# Altium footprint library PrISUm-ICs.PcbLib: 42 footprints (part 2 of 3)
Each footprint in its own frame and in the unit in brackets; x right, y up, seen from the top. Pads: shape width x height; smd on the part's side, far side on the other; paste and mask are expansions set on the pad; w line width, h text height; cw(c..) or ccw(c..) is an arc to the next point about the centre after c.
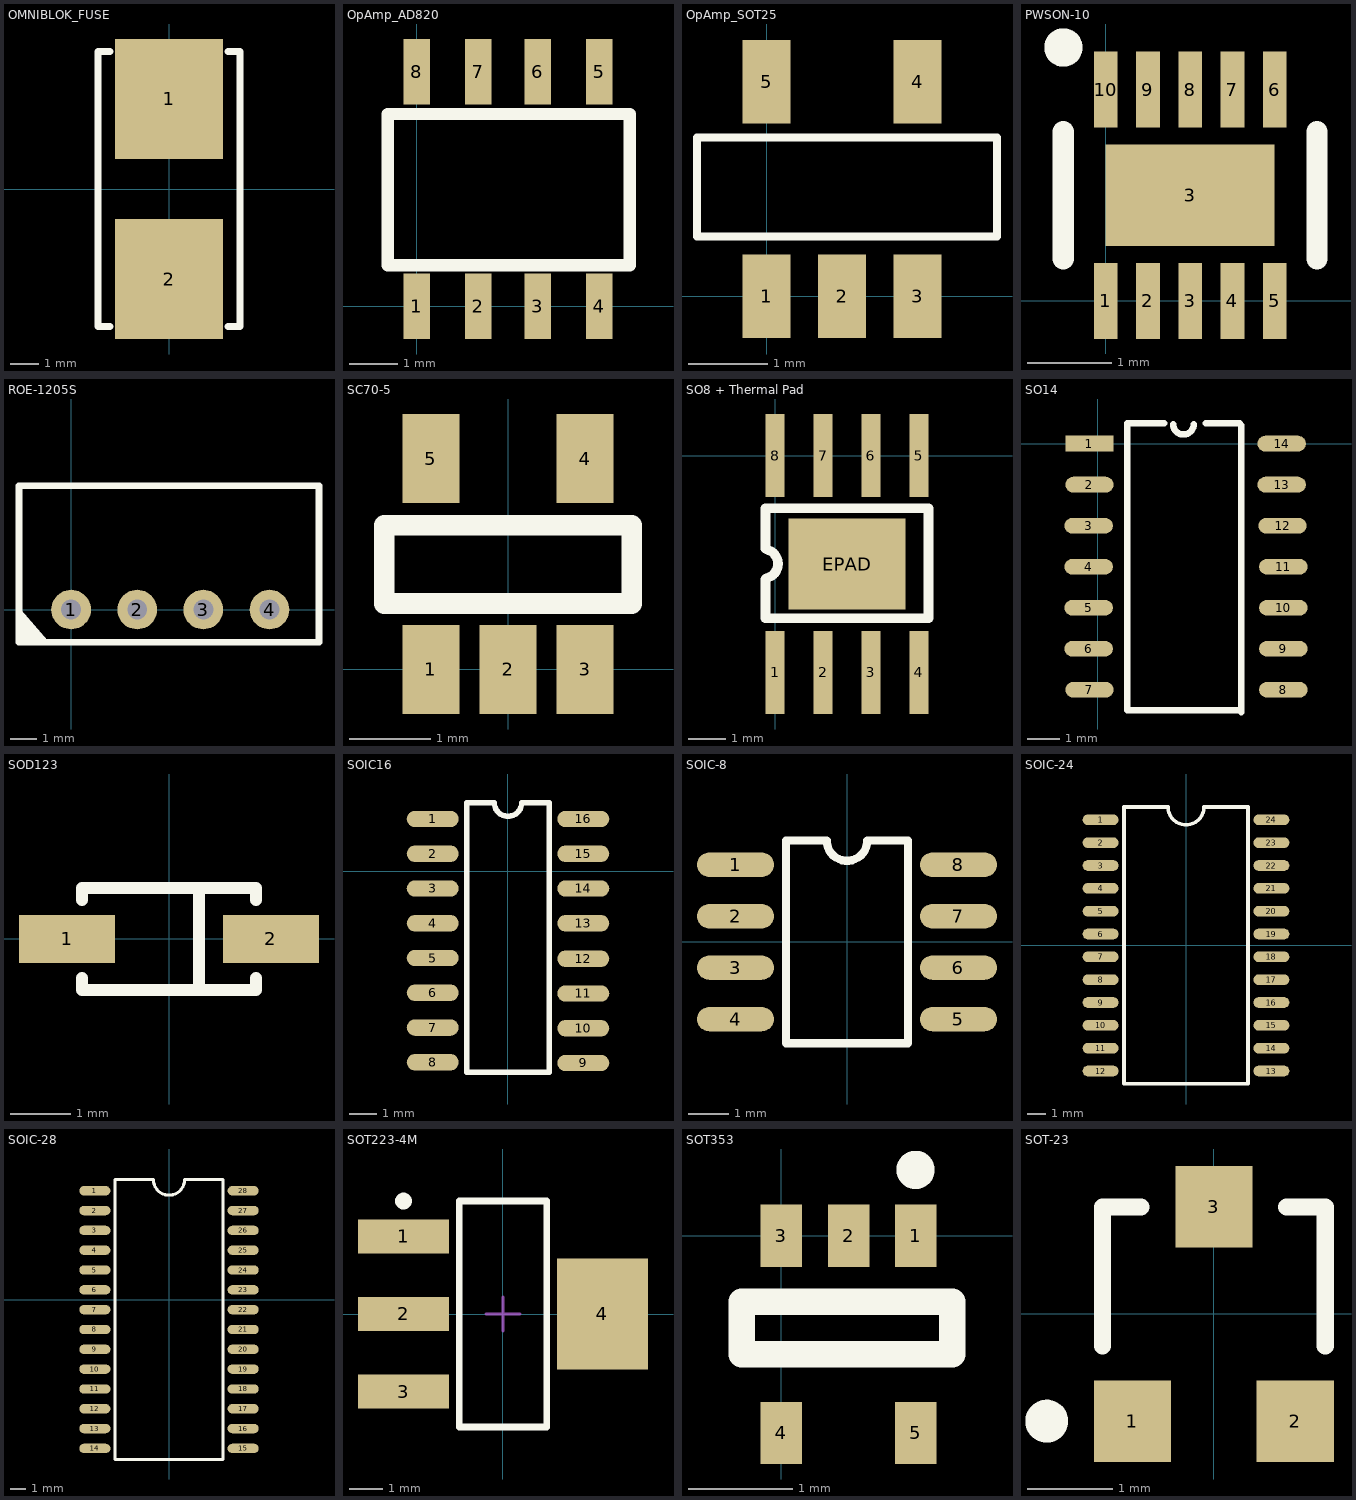
[diagram p1: the footprints below, top view; thin cyan lines are the x and y axes]

## OMNIBLOK_FUSE [mm]
pads (2):
  rect 3.81x4.24 smd: 1(0,3.2) 2(0,-3.18)
Top Overlay:
  lines w0.254: -2.1,-4.855 -2.515,-4.855 -2.515,4.875 -2.1,4.875 ; 2.1,-4.855 2.515,-4.855 2.515,4.875 2.1,4.875

## OpAmp_AD820 [mm]
pads (8):
  rect 0.55x1.35 smd: 1(0,0) 2(1.27,0) 3(2.5,0) 4(3.77,0) 5(3.77,4.85) 6(2.5,4.85) 7(1.27,4.85) 8(0,4.85)
Top Overlay:
  lines w0.254: -0.6,0.85 -0.6,3.975 4.4,3.975 4.4,0.85 -0.6,0.85

## OpAmp_SOT25 [mm]
pads (5):
  rect 0.6x1.05 smd: 1(0,0) 2(0.95,0) 3(1.9,0) 4(1.9,2.7) 5(0,2.7)
Top Overlay:
  lines w0.1: -0.875,0.75 -0.875,2 2.9,2 2.9,0.75 -0.875,0.75

## PWSON-10 [mm]
height 1
pads (11):
  rect 0.28x0.9 smd: 1(0,0) 2(0.5,0) 3(1,0) 4(1.5,0) 5(2,0) 6(2,2.5) 7(1.5,2.5) 8(1,2.5) 9(0.5,2.5) 10(0,2.5)
  rect 2x1.2 smd: 3(1,1.25)
Top Overlay:
  circle w0.254: c-0.5,3 r0.1
  lines w0.254: -0.5,0.5 -0.5,2 ; 2.5,0.5 2.5,2

## ROE-1205S [mil] "Isolated Power Supply ROE series RECOM power"
height 3937.01
pads (4):
  round 60 hole 30: 1(0,0) 2(100,0) 3(200,0) 4(300,0)
Top Overlay:
  lines w10: -78.74,-39.37 -78.74,-49.21 ; -78.74,-19 -52,-47 ; -78.74,-4 -39.37,-49.21 -78.74,-49.21 ; -67,-39 -78.74,-49.21 ; -64,-47 -78.74,-26 -78.74,-49.21 ; -78.74,-49.21 374.8,-49.21 374.8,187.01 -78.74,187.01 -78.74,-49.21

## SC70-5 [mm]
height 1.1
pads (5):
  rect 0.7x1.1 smd: 1(-0.95,0) 2(0,0) 3(0.95,0) 4(0.95,2.6) 5(-0.95,2.6)
Top Overlay:
  lines w0.254: -1.524,0.813 -1.524,1.778 1.524,1.778 1.524,0.813 -1.524,0.813

## SO8 + Thermal Pad [mm]
pads (9):
  rect 0.5x2.2 smd: 1(0,-5.75) 2(1.27,-5.75) 3(2.54,-5.75) 4(3.81,-5.75) 5(3.81,0) 6(2.54,0) 7(1.27,0) 8(0,0)
  rect 3.1x2.4 smd: EPAD(1.905,-2.875)
Top Overlay:
  lines w0.254: -0.254,-4.318 4.064,-4.318 4.064,-1.397 -0.254,-1.397 -0.254,-2.464 -0.229,-2.489 cw(c-0.314,-2.87) -0.229,-3.251 -0.254,-3.277 -0.254,-4.318

## SO14 [mm]
pads (14):
  rect 1.5x0.49 smd: 1(-0.25,0)
  oval 1.5x0.49 smd: 2(-0.25,-1.27) 3(-0.275,-2.54) 4(-0.275,-3.81) 5(-0.275,-5.08) 6(-0.275,-6.35) 7(-0.25,-7.62) 8(5.75,-7.62) 9(5.75,-6.35) 10(5.75,-5.08) 11(5.75,-3.81) 12(5.725,-2.54) 13(5.7,-1.27) 14(5.7,0)
Top Overlay:
  lines w0.2: 2.065,0.625 0.925,0.625 0.925,-8.255 4.45,-8.255 ; 2.34,0.6 ccw(c2.658,0.6) 2.975,0.6 ; 3.35,0.625 4.4,0.625 ; 4.45,-8.315 4.45,0.575
3D body "soic-14.stp": height 1.59, standoff -0.01, extent -0.279,-8.128 5.766,0.508

## SOD123 [mm]
pads (2):
  rect 1.6x0.8 smd: 1(-1.7,0) 2(1.7,0)
Top Overlay:
  lines w0.2: -1.45,-0.65 -1.45,-0.85 1.45,-0.85 1.45,-0.65 ; -1.45,0.65 -1.45,0.85 1.45,0.85 1.45,0.65 ; 0.5,-0.85 0.5,0.85

## SOIC16 [mm]
pads (16):
  oval 1.9x0.6 smd: 1(-2.75,1.905) 2(-2.75,0.635) 3(-2.75,-0.635) 4(-2.75,-1.905) 5(-2.75,-3.175) 6(-2.75,-4.445) 7(-2.75,-5.715) 8(-2.75,-6.985) 9(2.75,-7.01) 10(2.75,-5.74) 11(2.75,-4.47) 12(2.75,-3.2) 13(2.75,-1.905) 14(2.75,-0.635) 15(2.75,0.635) 16(2.75,1.905)
Top Overlay:
  lines w0.2: -1.5,-7.341 -1.5,2.5 -0.5,2.5 ccw(c0,2.5) 0.5,2.5 1.5,2.5 1.5,-7.341 -1.5,-7.341
3D body "SOIC16 narrow.stp": height 2, standoff 0, extent -3.081,-7.58 3.082,2.5

## SOIC-8 [mm] "SOIC, 8-Leads, Body 5.0x4.0mm (max), Pitch 1.27mm, IPC High Density"
height 1.75
pads (8):
  oval 1.9x0.6 smd: 1(-2.75,1.905) 2(-2.75,0.635) 3(-2.75,-0.635) 4(-2.75,-1.905) 5(2.75,-1.905) 6(2.75,-0.635) 7(2.75,0.635) 8(2.75,1.905)
Top Overlay:
  lines w0.2: -1.5,-2.5 -1.5,2.5 -0.5,2.5 ccw(c0,2.5) 0.5,2.5 1.5,2.5 1.5,-2.5 -1.5,-2.5
3D body "SOIC-8.stp": height 1.65, standoff -0.01, extent -3,-2.45 3,2.45

## SOIC-24 [mm] "SOIC, 24-Leads, Body 15.6x7.6mm (max), Pitch 1.27mm, IPC High Density"
height 2.65
pads (24):
  oval 2x0.6 smd: 1(-4.75,6.985) 2(-4.75,5.715) 3(-4.75,4.445) 4(-4.75,3.175) 5(-4.75,1.905) 6(-4.75,0.635) 7(-4.75,-0.635) 8(-4.75,-1.905) 9(-4.75,-3.175) 10(-4.75,-4.445) 11(-4.75,-5.715) 12(-4.75,-6.985) 13(4.75,-6.985) 14(4.75,-5.715) 15(4.75,-4.445) 16(4.75,-3.175) 17(4.75,-1.905) 18(4.75,-0.635) 19(4.75,0.635) 20(4.75,1.905) 21(4.75,3.175) 22(4.75,4.445) 23(4.75,5.715) 24(4.75,6.985)
Top Overlay:
  lines w0.2: -3.45,-7.7 -3.45,7.7 -1,7.7 ccw(c0,7.7) 1,7.7 3.45,7.7 3.45,-7.7 -3.45,-7.7
3D body "SOIC-24.stp": height 2.53, standoff -0.01, extent -5.125,-7.7 5.175,7.7

## SOIC-28 [mm]
pads (28):
  oval 2x0.6 smd: 1(-4.75,6.985) 2(-4.75,5.715) 3(-4.75,4.445) 4(-4.75,3.175) 5(-4.75,1.905) 6(-4.75,0.635) 7(-4.75,-0.635) 8(-4.75,-1.905) 9(-4.75,-3.175) 10(-4.75,-4.445) 11(-4.75,-5.715) 12(-4.75,-6.985) 13(-4.75,-8.255) 14(-4.75,-9.525) 15(4.75,-9.525) 16(4.75,-8.255) 17(4.75,-6.985) 18(4.75,-5.715) 19(4.75,-4.445) 20(4.75,-3.175) 21(4.75,-1.905) 22(4.75,-0.635) 23(4.75,0.635) 24(4.75,1.905) 25(4.75,3.175) 26(4.75,4.445) 27(4.75,5.715) 28(4.75,6.985)
Top Overlay:
  lines w0.2: -3.45,-10.24 3.45,-10.24 3.45,7.7 1,7.7 cw(c0,7.7) -1,7.7 -3.45,7.7 -3.45,-10.24
3D body "SOIC28 wide.stp": height 2, standoff 0, extent -5.082,-10.31 5.082,7.77

## SOT223-4M [mm]
pads (4):
  rect 2.7x1 smd: 1(-2.95,2.3) 2(-2.95,0) 3(-2.95,-2.3)
  rect 2.7x3.3 smd: 4(2.95,0)
Top Overlay:
  circle w0.25: c-2.95,3.35 r0.125
  lines w0.2: -1.3,-3.35 1.3,-3.35 1.3,3.35 -1.3,3.35 -1.3,-3.35
Mechanical 15:
  lines w0.1: -0.5,0 0.5,0 ; 0,-0.5 0,0.5
3D body "SOT223-3.step": height 1.6, standoff 0, extent -3.588,-3.3 3.486,3.2

## SOT353 [mm]
pads (5):
  rect 0.4x0.6 smd: 1(1.3,0) 2(0.65,0) 3(0,0) 4(0,-1.9) 5(1.3,-1.9)
Top Overlay:
  circle w0.254: c1.295,0.635 r0.057
  lines w0.254: -0.381,-1.143 1.651,-1.143 1.651,-0.635 -0.381,-0.635 -0.381,-1.143

## SOT-23 [mm]
pads (3):
  rect 0.9x0.95 smd: 1(-0.95,-1.25) 2(0.95,-1.25) 3(0,1.25)
Top Overlay:
  circle w0.25: c-1.95,-1.25 r0.125
  lines w0.2: -1.3,-0.375 -1.3,1.25 -0.85,1.25 ; 0.85,1.25 1.3,1.25 1.3,-0.375